# Altium integrated library CoLib.IntLib: 649 symbols (part 1 of 5) (continued)
## 精密电阻 1K
designator R?, comment 1K,0.1%,5ppm
精密电阻, 1K,  ± 0.1%, 1/8W, 5ppm, 0805; Manufacturer: PANASONIC; Ordering NO.: ERA6AEB102V; Name: 精密电阻
footprint R0805 (Chip Resistor; Body 2.0 x 1.3 mm (LxW typ))
pins: 1, 2

## 精密电阻 1K/0603
designator R?, comment 1K,0.1%,10ppm
精密电阻, 1K,  ± 0.1%, 1/10W, 10ppm, 0603; Manufacturer: VISHAY; Ordering NO.: TNPW06031K00BYEN; Name: 精密电阻
footprint R0603 (Chip Resistor, Body 60x30mil (1.6x0.8mm))
pins: 1, 2

## 精密电阻 2K
designator R?, comment 2K,0.1%,5ppm
精密电阻, 2K, ± 0.1%, 1/8W, 5ppm, 0805; Manufacturer: WELWYN; Ordering NO.: PCF0805-13-24K-B-T1; Name: 精密电阻
footprint R0805 (Chip Resistor; Body 2.0 x 1.3 mm (LxW typ))
pins: 1, 2

## 精密电阻 20K
designator R?, comment 20K,0.1%,25ppm
精密电阻, 20K,  ± 0.1%, 1/8W, 25ppm, 0805; Manufacturer: Panasonic; Ordering NO.: ERA6AEB203; Name: 精密电阻
footprint R0805 (Chip Resistor; Body 2.0 x 1.3 mm (LxW typ))
pins: 1, 2

## 精密电阻 24K
designator R?, comment 24K,0.05%,10ppm
精密电阻, 24K,  ± 0.05%, 1/8W, 10ppm, 0805; Manufacturer: Panasonic; Ordering NO.: ERA6ARW243V; Tips: 给AO212模块通道使用，RS库存编号662-1369; Name: 精密电阻
footprint R0805 (Chip Resistor; Body 2.0 x 1.3 mm (LxW typ))
pins: 1, 2

## 精密电阻 49.9R
designator R?, comment 49.9R,0.1%,15ppm
精密电阻, 49.9R,  ± 0.1%, 0.1W, 15ppm, 0805; Manufacturer: TE Connectivity; Ordering NO.: RP73D2A49R9BTG; Name: 精密电阻
footprint R0805 (Chip Resistor; Body 2.0 x 1.3 mm (LxW typ))
pins: 1, 2

## 精密电阻 100K
designator R?, comment 100K,0.1%,25ppm
精密电阻, 100K,  ± 0.1%, 1/8W, 25ppm, 0805; Manufacturer: Panasonic; Ordering NO.: ERA6AEB104; Name: 精密电阻
footprint R0805 (Chip Resistor; Body 2.0 x 1.3 mm (LxW typ))
pins: 1, 2

## 精密电阻 102R
designator R?, comment 102R,0.1%,10ppm
精密电阻, 102R,  ± 0.1%, 1/8W, 10ppm, 0805; Manufacturer: TE Connectivity; Ordering NO.: RN73C2A102RB; Name: 精密电阻
footprint R0805 (Chip Resistor; Body 80x50mil (2.0 x 1.3 mm))
pins: 1, 2

## 精密电阻 249R
designator R?, comment 249R,0.1%,5ppm
精密电阻, 249R,  ± 0.1%, 1/8W, 5ppm, 0805; Manufacturer: TE CONNECTIVITY; Ordering NO.: RN73C2A249RBTDF; Name: 精密电阻
footprint R0805 (Chip Resistor; Body 2.0 x 1.3 mm (LxW typ))
pins: 1, 2

## 精密电阻 499K
designator R?, comment 499K,0.1%,5ppm
精密电阻, 499K,  ± 0.1%, 1/8W, 25ppm, 0805; Manufacturer: SUSUMU; Ordering NO.: RR1220P-4993-B-M-T5; Name: 精密电阻
footprint R0805 (Chip Resistor; Body 2.0 x 1.3 mm (LxW typ))
pins: 1, 2


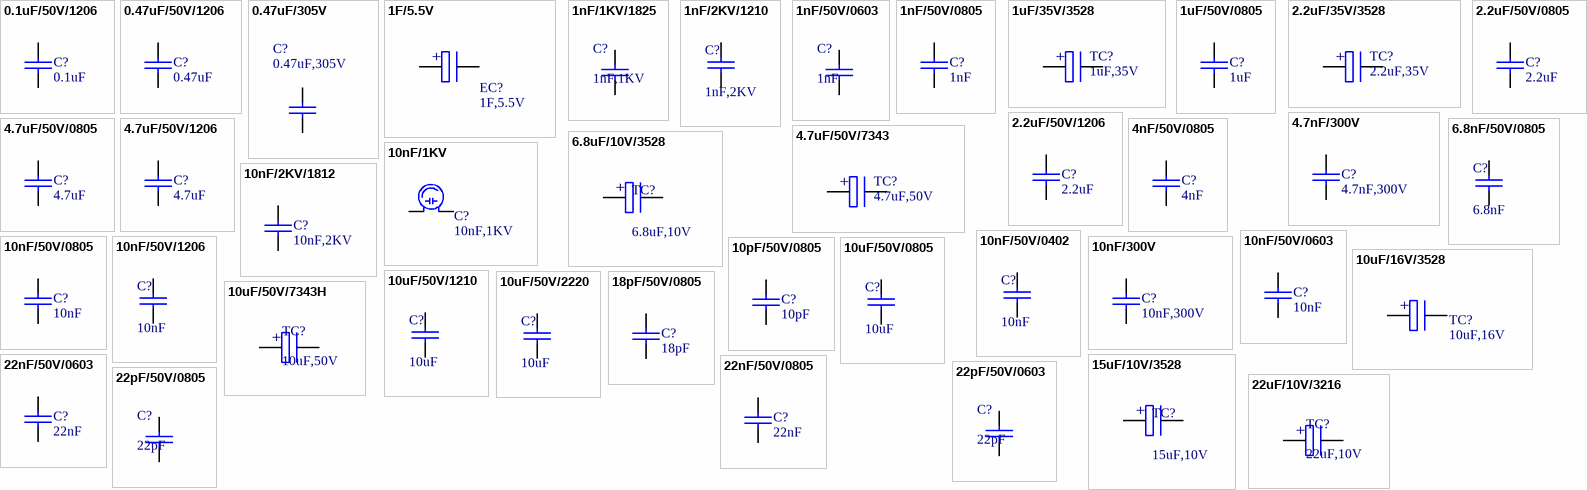
[diagram p4: symbols 0.1uF/50V/1206 to 22uF/10V/3216]

## 0.1uF/50V/1206
designator C?, comment 0.1uF
普通电容, 0.1uF, X7R, 50V, 10％, 1206; Manufacturer: TDK; Name: 普通电容; Ordering NO.: 0.1uF
footprint C1206 (Chip Capacitor, Body 3.2x1.6mm, IPC Medium Density)
pins: 1, 2

## 0.47uF/50V/1206
designator C?, comment 0.47uF
普通电容, 0.47uF, X7R, 50V, 10％, 1206; Manufacturer: TDK; Name: 普通电容; Ordering NO.: 0.47uF
footprint C1206 (Chip Capacitor, Body 3.2x1.6mm, IPC Medium Density)
pins: 1, 2

## 0.47uF/305V
designator C?, comment 0.47uF,305V
安规电容-X电容,0.47uF,305VAC,直插; Manufacturer: Epcos; Ordering NO.: B32933B3474K; Name: 安规电容- X电容
footprint CAP-22.5
pins: 1, 2

## 1F/5.5V
designator EC?, comment 1F,5.5V
铝电解电容,1F,20%,5.5V,直插; Manufacturer: KAMCAP; Ordering NO.: SCCB5R5105C; Name: 铝电解电容
footprint CAPC-5.08 (超级电容直插封装,直径800mil,pitch=200mil)
pins: 1 P, 2 P
text: +

## 1nF/1KV/1825
designator C?, comment 1nF,1KV
高压电容, 1nF, 10%, 1KV, 1825, C0G; Manufacturer: AVX; tips: 地线间EMC电容,体积大; 物料替代型号: 1825AC102JAT1A(5%); Ordering NO.: 1825AC102KAT1A; Tips: 1825,1000V,C0G,10%,有铅,; Name: 高压电容; Price: 0.51
footprint C1825 (贴片电容1825, 180 x 250 mil)
pins: 1, 2

## 1nF/2KV/1210
designator C?, comment 1nF,2KV
高压电容, 1nF, X7R, 2KV, 10％, 1210; Manufacturer: Syfer Technology; Ordering NO.: 1210Y2K00102KXT; Name: 高压电容
footprint C1210 (公制名称为3225)
pins: 1, 2

## 1nF/50V/0603
designator C?, comment 1nF
高频电容, 1nF, 5%, 50V, 0603, C0G; Manufacturer: AVX; Ordering NO.: 06035A102JAT2A; tips: 贴片0603,102%5/50V,C0G; 物料替代型号: 村田; Tips: 虽为高频电容,做EMC也是不错的; Name: 高频电容; Price: 0.02
footprint C0603 (Chip Capacitor, Body 1.6x0.8mm, IPC Medium Density)
pins: 1, 2

## 1nF/50V/0805
designator C?, comment 1nF
普通电容, 1nF, X7R, 50V, 10％, 0805; Manufacturer: TDK; Ordering NO.: 1nF; Name: 普通电容
footprint C0805 (Chip Capacitor, Body 2.0x1.3mm, IPC Medium Density)
pins: 1, 2

## 1uF/35V/3528
designator TC?, comment 1uF,35V
钽电容, 1uF, 35V, 10％, 3528; Manufacturer: AVX; Name: 钽电容; Ordering NO.: 1uF
footprint C3528 (B,Chip Capacitor, Body 3.5x2.8mm)
pins: 1 P, 2 P
text: +

## 1uF/50V/0805
designator C?, comment 1uF
普通电容, 1uF, X7R, 50V, 10％, 0805; Manufacturer: TDK; Ordering NO.: 1uF; Name: 普通电容
footprint C0805 (Chip Capacitor, Body 2.0x1.3mm, IPC Medium Density)
pins: 1, 2

## 2.2uF/35V/3528
designator TC?, comment 2.2uF,35V
钽电容, 2.2uF, 35V, 10％, 3528; Manufacturer: AVX; Name: 钽电容; Ordering NO.: 2.2uF
footprint C3528 (B,Chip Capacitor, Body 3.5x2.8mm)
pins: 1 P, 2 P
text: +

## 2.2uF/50V/0805
designator C?, comment 2.2uF
普通电容, 2.2uF, X7R, 50V, 10％, 0805; Manufacturer: TDK; Name: 普通电容; Ordering NO.: 2.2uF
footprint C0805 (Chip Capacitor, Body 2.0x1.3mm, IPC Medium Density)
pins: 1, 2

## 2.2uF/50V/1206
designator C?, comment 2.2uF
普通电容, 2.2uF, X7R, 50V, 10％, 1206; Manufacturer: TDK; Name: 普通电容; Ordering NO.: 2.2uF
footprint C1206 (Chip Capacitor, Body 3.2x1.6mm, IPC Medium Density)
pins: 1, 2

## 4.7nF/300V
designator C?, comment 4.7nF,300V
安规电容-Y电容,4.7nF,300V,10%,直插; Manufacturer: Epcos; Ordering NO.: B32021A3472K; Tips: 薄膜电容，用于EMI抑制; Name: 安规电容-Y电容
footprint CAP-10 (长*宽为13*5)
pins: 1, 2

## 4.7uF/50V/0805
designator C?, comment 4.7uF
普通电容, 4.7uF, X7R, 50V, 10％, 0805; Manufacturer: TDK; Name: 普通电容; Ordering NO.: 4.7uF
footprint C0805 (Chip Capacitor, Body 2.0x1.3mm, IPC Medium Density)
pins: 1, 2

## 4.7uF/50V/1206
designator C?, comment 4.7uF
普通电容, 4.7uF, X7R, 50V, 10％, 1206; Manufacturer: TDK; Name: 普通电容; Ordering NO.: 4.7uF
footprint C1206
pins: 1, 2

## 4.7uF/50V/7343
designator TC?, comment 4.7uF,50V
钽电容, 4.7uF, 50V, 10％, 7343; Manufacturer: AVX; Name: 钽电容; Ordering NO.: 4.7uF
footprint C7343 (D,Chip Capacitor, Body7.3x4.3mm)
pins: 1 P, 2 P
text: +

## 4nF/50V/0805
designator C?, comment 4nF
普通电容, 4nF, X7R, 50V, 10％, 0805; Manufacturer: TDK; Name: 普通电容; Ordering NO.: 4nF
footprint C0805 (Chip Capacitor, Body 2.0x1.3mm, IPC Medium Density)
pins: 1, 2

## 6.8nF/50V/0805
designator C?, comment 6.8nF
普通电容, 6.8nF, X7R, 50V, 10％, 0805; Manufacturer: TDK; Ordering NO.: 6.8nF; Name: 普通电容
footprint C0805
pins: 1, 2

## 6.8uF/10V/3528
designator TC?, comment 6.8uF,10V
钽电容, 6.8uF,10V, 10％, 3528; Manufacturer: AVX; Ordering NO.: TPSB685K010R1300; Name: 钽电容
footprint C3528 (B封装,极性电容, Body 3.5x2.8mm)
pins: 1 P, 2 P
text: +

## 10nF/1KV
designator C?, comment 10nF,1KV
高压瓷片电容, 10nF, 1000V,直插; Manufacturer: TDK; Tips: 高压瓷片电容10nF/1KV; Name: 高压瓷片电容; 物料替代型号: n/a; Ordering NO.: 10nF; Price: 0.8
footprint CAP-5 (Footprint not found)
pins: 1, 2

## 10nF/2KV/1812
designator C?, comment 10nF,2KV
高压电容, 10nF, 2KV, 1812; Manufacturer: AVX; Ordering NO.: 1812GC103KAT3A; Name: 高压电容
footprint C1812 (Chip Capacitor, 2-Leads, Body 4.5x3.2mm, IPC Medium Density)
pins: 1, 2

## 10nF/50V/0402
designator C?, comment 10nF
普通电容, 10nF, X7R, 50V, 10％, 0402; Manufacturer: TDK; Ordering NO.: 10nF; Name: 普通电容
footprint C0402-BGA
pins: 1, 2

## 10nF/50V/0603
designator C?, comment 10nF
普通电容, 10nF, X7R, 50V, 10％, 0603; Manufacturer: TDK; Ordering NO.: 10nF; Name: 普通电容
footprint C0603 (Chip Capacitor, Body 1.6x0.8mm, IPC Medium Density)
pins: 1, 2

## 10nF/50V/0805
designator C?, comment 10nF
普通电容, 10nF, X7R, 50V, 10％, 0805; Manufacturer: TDK; Ordering NO.: 10nF; Name: 普通电容
footprint C0805 (Chip Capacitor, Body 2.0x1.3mm, IPC Medium Density)
pins: 1, 2

## 10nF/50V/1206
designator C?, comment 10nF
普通电容, 10nF, X7R, 50V, 10％, 1206; Manufacturer: TDK; Name: 普通电容; Ordering NO.: 10nF
footprint C1206 (Chip Capacitor, Body 3.2x1.6mm, IPC Medium Density)
pins: 1, 2

## 10nF/300V
designator C?, comment 10nF,300V
安规电容-Y电容,10nF,300V,10%,直插; Manufacturer: Epcos; Ordering NO.: B32022A3103K; Tips: 薄膜电容，用于EMI抑制; Name: 安规电容-Y电容
footprint CAP-15 (长*宽*高为18*5*10.5)
pins: 1, 2

## 10pF/50V/0805
designator C?, comment 10pF
普通电容, 10pF, X7R, 50V, 10％, 0805; Manufacturer: TDK; Name: 普通电容; Ordering NO.: 10pF
footprint C0805 (Chip Capacitor, Body 2.0x1.3mm, IPC Medium Density)
pins: 1, 2

## 10uF/16V/3528
designator TC?, comment 10uF,16V
钽电容, 10uF, 16V, 10％, 3528; Manufacturer: AVX; Ordering NO.: TPSB106K016R0500; Name: 钽电容
footprint C3528 (B,Chip Capacitor, Body 3.5x2.8mm)
pins: 1 P, 2 P
text: +

## 10uF/50V/0805
designator C?, comment 10uF
普通电容, 10uF, X7R, 50V, 10％, 0805; Manufacturer: TDK; Name: 普通电容; Ordering NO.: 10uF
footprint C0805 (Chip Capacitor, Body 2.0x1.3mm, IPC Medium Density)
pins: 1, 2

## 10uF/50V/1210
designator C?, comment 10uF
普通电容, 10uF, X7S, 50V, 10％, 1210; Manufacturer: TDK; Ordering NO.: C3225X7S1H106KT000N; Name: 普通电容
footprint C1210 (贴片电容有极性1210,138x110mil)
pins: 1, 2

## 10uF/50V/2220
designator C?, comment 10uF
普通电容, 10uF, X7R, 50V, 10％, 2220; Manufacturer: TDK; Name: 普通电容; Ordering NO.: 10uF
footprint C2220
pins: 1, 2

## 10uF/50V/7343H
designator TC?, comment 10uF,50V
钽电容, 10uF, 50V, 7343H; Manufacturer: AVX; Ordering NO.: TPSE106M050R0500; Tips: 贴片极性去耦滤波电容,2917,E型,10uF%20/50V,500mR@100KHz,(钽/电解); 物料替代型号: TPSE106M050R0400,村田; Name: 钽电容; Price: 2.01
footprint C7343H (E封装,极性电容, Body7.3x4.3mm)
pins: 1 P, 2 P
text: +

## 15uF/10V/3528
designator TC?, comment 15uF,10V
钽电容, 15uF,10V, 10％, 3528; Manufacturer: AVX; Ordering NO.: TPSB156K010R0450; Name: 钽电容
footprint C3528 (B封装,极性电容, Body 3.5x2.8mm)
pins: 1 P, 2 P
text: +

## 18pF/50V/0805
designator C?, comment 18pF
普通电容, 18pF, X7R, 50V, 10％, 0805; Manufacturer: TDK; Name: 普通电容; Ordering NO.: 18pF
footprint C0805 (Chip Capacitor, Body 2.0x1.3mm, IPC Medium Density)
pins: 1, 2

## 22nF/50V/0603
designator C?, comment 22nF
普通电容, 22nF, X7R, 50V, 10％, 0603; Manufacturer: TDK; Name: 普通电容; Ordering NO.: 22nF
footprint C0603 (Chip Capacitor, Body 1.6x0.8mm, IPC Medium Density)
pins: 1, 2

## 22nF/50V/0805
designator C?, comment 22nF
普通电容, 22nF, X7R, 50V, 10％, 0805; Manufacturer: TDK; Name: 普通电容; Ordering NO.: 22nF
footprint C0805 (Chip Capacitor, Body 2.0x1.3mm, IPC Medium Density)
pins: 1, 2

## 22pF/50V/0603
designator C?, comment 22pF
高频电容, 22pF, 50V, 0603, C0G; Manufacturer: AVX; Ordering NO.: 06035A220JAT2A; tips: 贴片0603,22pF%5/50V,C0G; 物料替代型号: 村田; Tips: 虽为高频电容,做EMC也是不错的; Name: 高频电容; Price: 0.02
footprint C0603 (Chip Capacitor, Body 1.6x0.8mm, IPC Medium Density)
pins: 1, 2

## 22pF/50V/0805
designator C?, comment 22pF
高频电容, 22pF, 50V, 0805, C0G; Manufacturer: AVX; Ordering NO.: 08055A220JAT2A; 物料替代型号: 村田; tips: 虽为高频电容,做EMC也是不错的; Tips: 贴片0805,22pF%5/50V,C0G; Name: 高频电容; Price: 0.02
footprint C0805 (Chip Capacitor, Body 2.0x1.3mm, IPC Medium Density)
pins: 1, 2

## 22uF/10V/3216
designator TC?, comment 22uF,10V
钽电容, 22uF, 10V, 3216, 900mR@100KH; Manufacturer: AVX; Ordering NO.: TPSA226K010R0900; Tips: 贴片极性去耦滤波电容1206,22uF%10/10V,900mR@100KHz,(钽/电解); 物料替代型号: TPSA336K010R0700,村田; Name: 钽电容; Price: 0.20
footprint C3216 (A封装,极性电容, Body 3.2x1.6mm)
pins: 1 P, 2 P
text: +

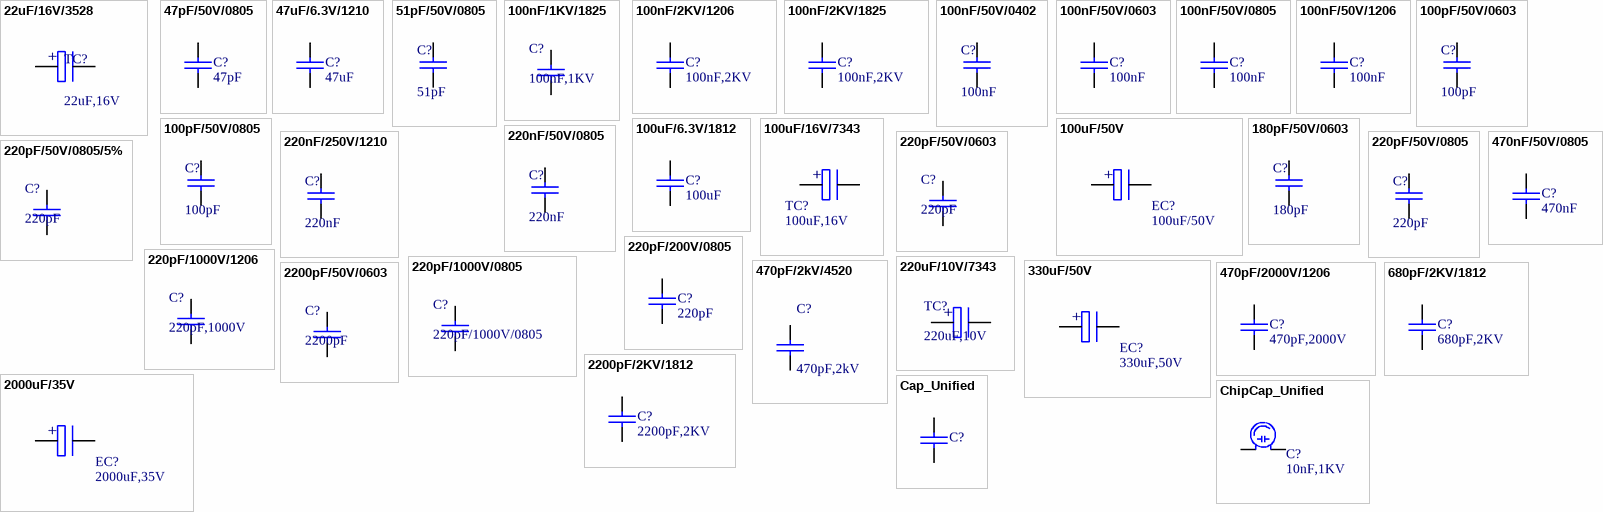
[diagram p5: symbols 22uF/16V/3528 to ChipCap_Unified]

## 22uF/16V/3528
designator TC?, comment 22uF,16V
钽电容,22uF,16V, 10％, 3528; Manufacturer: AVX; Ordering NO.: TPSB226K016R0400; Name: 钽电容
footprint C3528 (B封装,极性电容, Body 3.5x2.8mm)
pins: 1 P, 2 P
text: +

## 47pF/50V/0805
designator C?, comment 47pF
普通电容, 47pF, X7R, 50V, 10％, 0805; Manufacturer: TDK; Name: 普通电容; Ordering NO.: 47pF
footprint C0805 (Chip Capacitor, Body 2.0x1.3mm, IPC Medium Density)
pins: 1, 2

## 47uF/6.3V/1210
designator C?, comment 47uF
普通电容, 47uF, X5R, 6.3V, 1210; Manufacturer: TDK; Name: 普通电容; Ordering NO.: 47uF
footprint C1210 (公制名称为3225)
pins: 1, 2

## 51pF/50V/0805
designator C?, comment 51pF
普通电容, 51pF, X7R, 50V, 10％, 0805; Manufacturer: TDK; Name: 普通电容; Ordering NO.: 51pF
footprint C0805 (Chip Capacitor, Body 2.0x1.3mm, IPC Medium Density)
pins: 1, 2

## 100nF/1KV/1825
designator C?, comment 100nF,1KV
高压电容, 100nF, 10%, 1000V, 1825, C0G, 有铅; Manufacturer: AVX; tips: 地线间EMC电容,体积大; 物料替代型号: 1825AC104JAT1A(5%); Ordering NO.: 1825AC104KAT1A; Tips: 1825,1000V,C0G,10%,有铅,; Name: 高压电容; Price: 0.51
footprint C1825 (贴片电容1825, 180 x 250 mil)
pins: 1, 2

## 100nF/2KV/1206
designator C?, comment 100nF,2KV
高压电容, 100nF, 2KV, 10％, 1206; Manufacturer: TDK; Ordering NO.: CGA5L4X7T2W104K160AA; Name: 高压电容
footprint C1206 (Chip Capacitor, Body 3.2x1.6mm, IPC Medium Density)
pins: 1, 2

## 100nF/2KV/1825
designator C?, comment 100nF,2KV
高压电容, 100nF, 2KV, 10％, 1825; Manufacturer: TDK; Name: 高压电容; Ordering NO.: 100nF
footprint C1825 (贴片电容1825, 180 x 250 mil)
pins: 1, 2

## 100nF/50V/0402
designator C?, comment 100nF
普通电容, 100nF, X7R, 50V, 10％, 0402; Manufacturer: TDK; Ordering NO.: 100nF; Name: 普通电容
footprint C0402-BGA
pins: 1, 2

## 100nF/50V/0603
designator C?, comment 100nF
普通电容, 100nF, X7R, 50V, 10％, 0603; Manufacturer: TDK; Ordering NO.: 100nF; Name: 普通电容
footprint C0603
pins: 1, 2

## 100nF/50V/0805
designator C?, comment 100nF
普通电容, 100nF, X7R, 50V, 10％, 0805; Manufacturer: TDK; Ordering NO.: 100nF; Name: 普通电容
footprint C0805 (Chip Capacitor, Body 2.0x1.3mm, IPC Medium Density)
pins: 1, 2

## 100nF/50V/1206
designator C?, comment 100nF
普通电容, 100nF, X7R, 50V, 10％, 1206; Manufacturer: TDK; Name: 普通电容; Ordering NO.: 100nF
footprint C1206 (Chip Capacitor, Body 3.2x1.6mm, IPC Medium Density)
pins: 1, 2

## 100pF/50V/0603
designator C?, comment 100pF
普通电容, 100pF, X7R, 50V, 10％, 0603; Manufacturer: TDK; Ordering NO.: 100pF; Name: 普通电容
footprint C0603
pins: 1, 2

## 100pF/50V/0805
designator C?, comment 100pF
普通电容, 100pF, X7R, 50V, 10％, 0805; Manufacturer: TDK; Ordering NO.: 100pF; Name: 普通电容
footprint C0805 (Chip Capacitor, Body 2.0x1.3mm, IPC Medium Density)
pins: 1, 2

## 100uF/6.3V/1812
designator C?, comment 100uF
普通电容, 100uF, X5R, 6.3V, 1812; Manufacturer: TDK; Name: 普通电容; Ordering NO.: 100uF
footprint C1812
pins: 1, 2

## 100uF/16V/7343
designator TC?, comment 100uF,16V
钽电容, 100uF, 16V, 10%,7343; Manufacturer: AVX; Ordering NO.: TPSD107K016R0060; Name: 钽电容
footprint C7343 (D,Chip Capacitor, Body7.3x4.3mm)
pins: 1 P, 2 P
text: +

## 100uF/50V
designator EC?
铝电解电容,100uF,20%,50V,表贴; Manufacturer: Panasonic; Ordering NO.: EEHZA1H101P; Name: 铝电解电容
footprint CP1210 (G,Conductive Polymer Hybrid Aluminum Electrolytic Capacitors,12X10.3X10.5mm)
pins: 1 P, 2 P
text: +

## 180pF/50V/0603
designator C?, comment 180pF
普通电容,180pF, 5％,50V, 0603,C0G; Manufacturer: TDK; Name: 普通电容; Ordering NO.: 180pF
footprint C0603 (Chip Capacitor, Body 1.6x0.8mm, IPC Medium Density)
pins: 1, 2

## 220nF/50V/0805
designator C?, comment 220nF
普通电容, 220nF, X7R, 50V, 10％, 0805; Manufacturer: TDK; Name: 普通电容; Ordering NO.: 220nF
footprint C0805 (Chip Capacitor, Body 2.0x1.3mm, IPC Medium Density)
pins: 1, 2

## 220nF/250V/1210
designator C?, comment 220nF
普通电容, 220nF, X5R, 250V, 10％, 1210; Manufacturer: TDK; Name: 普通电容; Ordering NO.: 220nF
footprint C1210 (公制名称为3225)
pins: 1, 2

## 220pF/50V/0603
designator C?, comment 220pF
高频电容, 220pF, 5%, 50V, 0603, C0G; Manufacturer: AVX; Ordering NO.: 06035A221JAT2A; tips: 贴片0603,220pF%5/50V,C0G; 物料替代型号: 村田; Tips: 虽为高频电容,做EMC也是不错的; Name: 高频电容; Price: 0.02
footprint C0603 (Chip Capacitor, Body 1.6x0.8mm, IPC Medium Density)
pins: 1, 2

## 220pF/50V/0805
designator C?, comment 220pF
普通电容, 220pF, X7R, 50V, 10％, 0805; Manufacturer: TDK; Name: 普通电容; Ordering NO.: 220pF
footprint C0805 (Footprint not found)
pins: 1, 2

## 220pF/50V/0805/5%
designator C?, comment 220pF
高频电容, 220pF, 5%, 50V, 0805, C0G; Manufacturer: AVX; Ordering NO.: 08055A221JAT2A; tips: 贴片0805,220pF%5/50V,C0G; 物料替代型号: 村田; Tips: 虽为高频电容,做EMC也是不错的; Name: 高频电容; Price: 0.02
footprint C0805 (Chip Capacitor, Body 2.0x1.3mm, IPC Medium Density)
pins: 1, 2

## 220pF/200V/0805
designator C?, comment 220pF
高频电容, 220pF, 5%, 200V, 0805, C0G; Manufacturer: AVX; Ordering NO.: 08052A221JAT2A; tips: 贴片0805,220pF%5/200V,C0G; 物料替代型号: 村田; Tips: 虽为高频电容,做EMC也是不错的; Name: 高频电容; Price: 0.02
footprint C0805 (Chip Capacitor, Body 2.0x1.3mm, IPC Medium Density)
pins: 1, 2

## 220pF/1000V/0805
designator C?
高压电容, 220pF, X7R, 5%, 1000V, 0805; Manufacturer: AVX; Ordering NO.: 0805AA221JAT1A; Tips: 小型220pF EMC电容; Price: 0.50; Name: 高压电容
footprint C0805 (Chip Capacitor, Body 2.0x1.3mm, IPC Medium Density)
pins: 1, 2

## 220pF/1000V/1206
designator C?, comment 220pF,1000V
高压电容, 220pF, X7R, 5%, 1000V, 1206; Manufacturer: AVX; 物料替代型号: 1206AA221JAT1A; Tips: EMC电容,体积大; Price: 0.50; Name: 高压电容; Ordering NO.: 220pF
footprint C1206 (Chip Capacitor, Body 3.2x1.6mm, IPC Medium Density)
pins: 1, 2

## 220uF/10V/7343
designator TC?, comment 220uF,10V
钽电容, 220uF, 20％, 10V, 7343; Manufacturer: SANYO/Panasonic; Ordering NO.: 10TPB220M; Tips: 电源用极性电容; Name: 钽电容
footprint C7343 (D封装,极性电容, Body7.3x4.3mm)
pins: 1 P, 2 N
text: +

## 330uF/50V
designator EC?, comment 330uF,50V
铝电解电容,330uF,20%,50V,直插; Manufacturer: Panasonic; Ordering NO.: EEUTA1H331S; Name: 铝电解电容
footprint CAPC-7.5-D16 (Body Dia. 16mm,Lead space 7.5mm)
pins: 1 P, 2 P
text: +

## 470nF/50V/0805
designator C?, comment 470nF
普通电容, 470nF, X7R, 50V, 10％, 0805; Manufacturer: TDK; Name: 普通电容; Ordering NO.: 470nF
footprint C0805
pins: 1, 2

## 470pF/2kV/4520
designator C?, comment 470pF,2kV
高压电容,470pF,2kV,4520; Ordering NO.: GR442QR73D471KW01L; Name: 高压电容
footprint C4520 (Chip Capacitor, Body 4.5x2.0mm)
pins: 1, 2

## 470pF/2000V/1206
designator C?, comment 470pF,2000V
高压电容, 470pF, 2000V, 1206; Manufacturer: Muiticomp; Ordering NO.: MCA000784; Name: 高压电容
footprint C1206 (Chip Capacitor, Body 3.2x1.6mm, IPC Medium Density)
pins: 1, 2

## 680pF/2KV/1812
designator C?, comment 680pF,2KV
高压电容, 680pF,2KV, 1812; Manufacturer: AVX; Ordering NO.: 1812GC681KAT1A; Name: 高压电容
footprint C1812
pins: 1, 2

## 2000uF/35V
designator EC?, comment 2000uF,35V
铝电解电容,2000uF,20%,35V,直插; Manufacturer: Panasonic; Ordering NO.: EEUTP1V202S; Name: 铝电解电容
footprint CAPC-7.5-D18 (Body Dia. 18mm,Lead space 7.5mm)
pins: 1 P, 2 P
text: +

## 2200pF/2KV/1812
designator C?, comment 2200pF,2KV
高压电容, 2200pF, 2KV, 1812; Manufacturer: AVX; Ordering NO.: 1812GC222KAT1A; Name: 高压电容
footprint C1812
pins: 1, 2

## 2200pF/50V/0603
designator C?, comment 2200pF
高频电容, 2200pF, 5%, 50V, 0603, C0G; Manufacturer: AVX; Ordering NO.: 06035A221JAT2A; tips: 贴片0603,221%5/50V,C0G; 物料替代型号: 村田; Tips: 虽为高频电容,做EMC也是不错的; Name: 高频电容; Price: 0.02
footprint C0603 (Chip Capacitor, Body 1.6x0.8mm, IPC Medium Density)
pins: 1, 2

## Cap_Unified
designator C?
普通电容,通用; Price: 0.02; Name: 普通电容
footprint C0805 (Chip Capacitor, Body 2.0x1.3mm, IPC Medium Density)
footprint C0603 (Chip Capacitor, Body 1.6x0.8mm, IPC Medium Density)
footprint C0402 (Footprint not found)
footprint C1206 (Chip Capacitor, Body 3.2x1.6mm, IPC Medium Density)
pins: 1, 2

## ChipCap_Unified
designator C?, comment 10nF,1KV
瓷片电容; Price: 0.8
footprint CAP-7.62 (Footprint not found)
pins: 1, 2


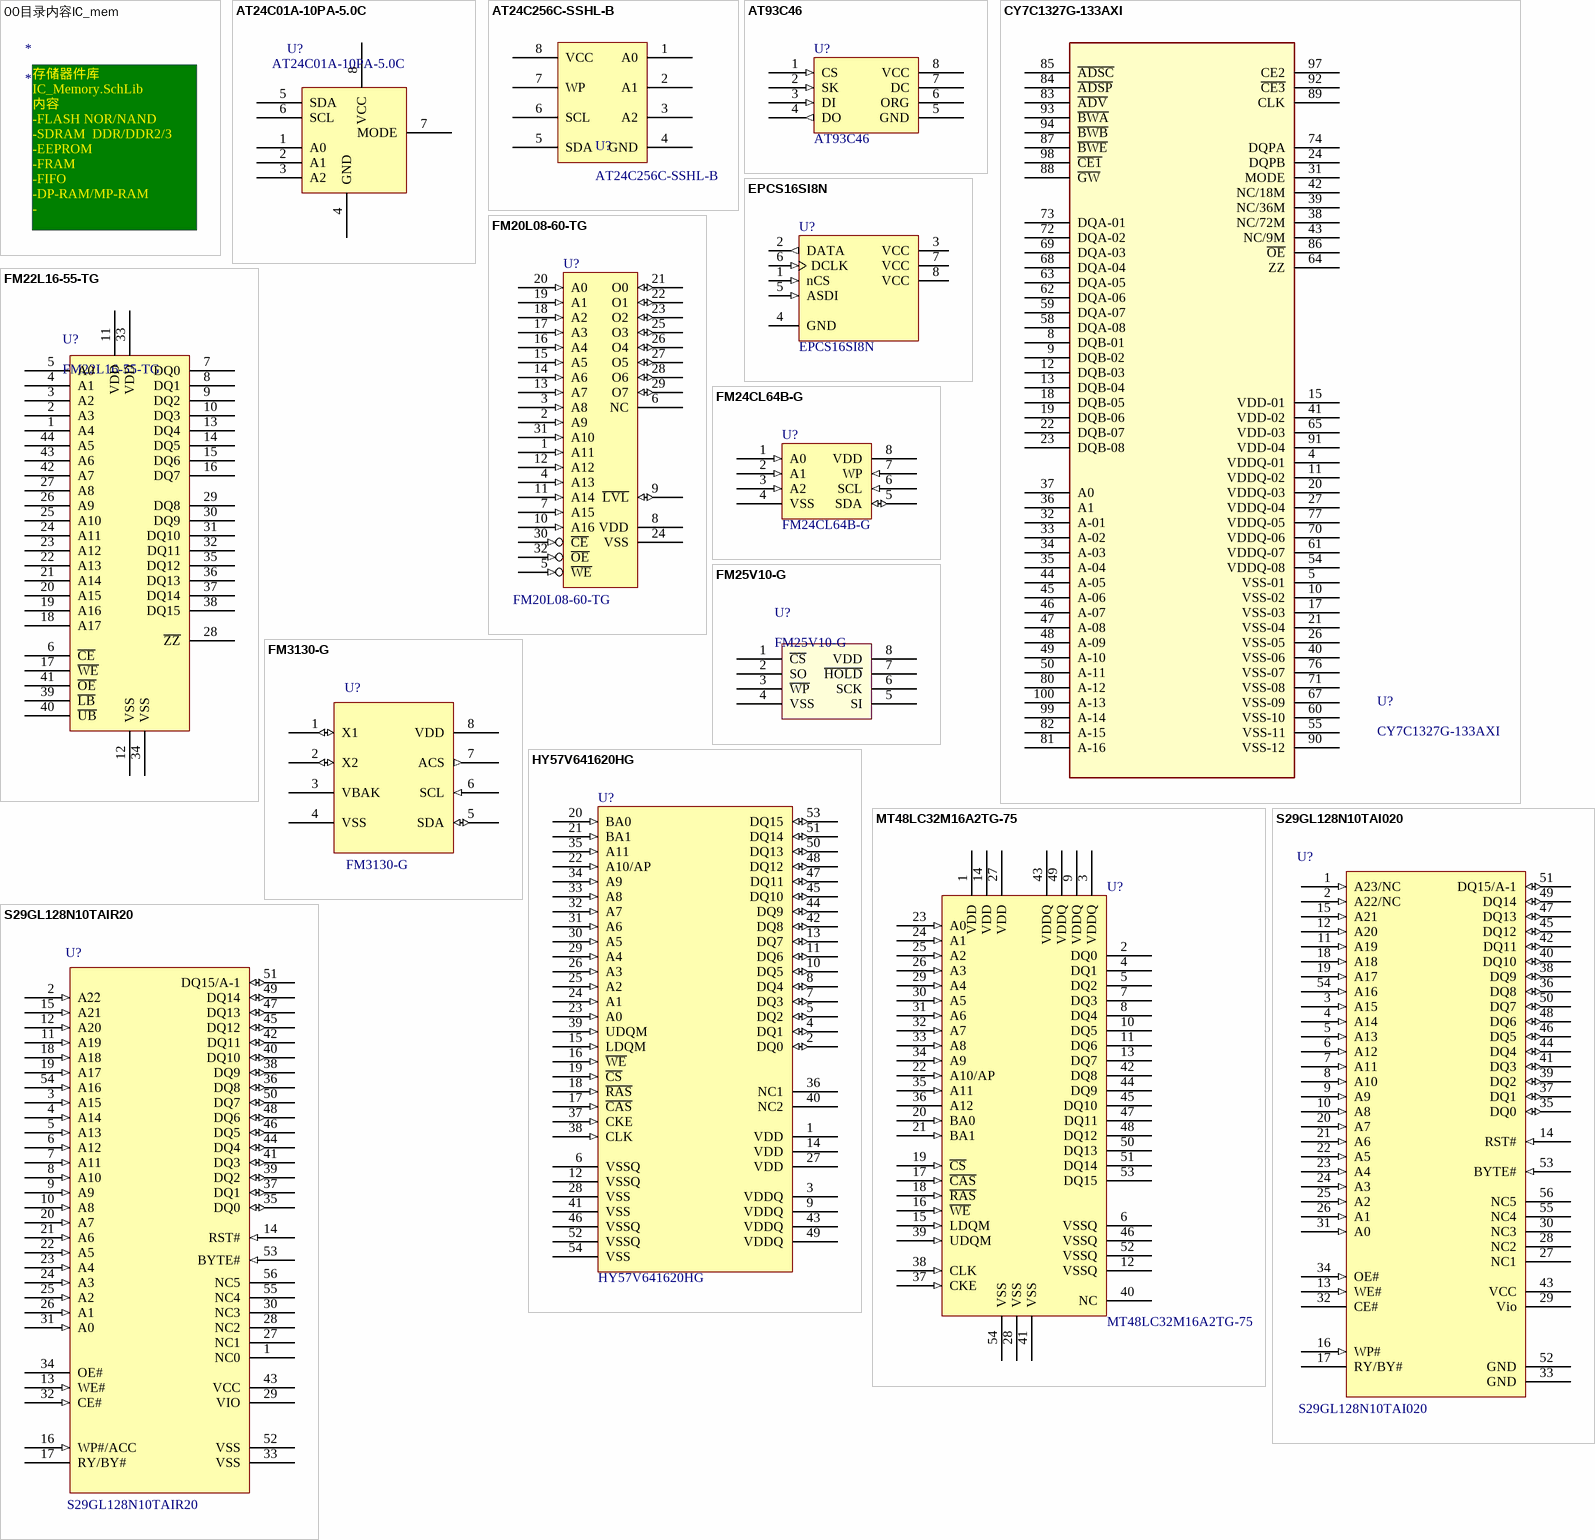
[diagram p6: symbols 00目录内容IC_mem to S29GL128N10TAIR20]

## 00目录内容IC_mem
designator *
text: 存储器件库 IC_Memory.SchLib / 内容 / -FLASH NOR/NAND / -SDRAM  DDR/DDR2/3 / -EEPROM / -FRAM / -FIFO / -DP-RAM/MP-RAM / - /

## AT24C01A-10PA-5.0C
designator U?
2K,256x8 EEPROM; Manufacturer: ATMEL; Price: 3.5; Ordering NO.: AT24C01A-10PA-5.0C; Name: EEPROM
footprint SO8/1.27_4.9*3.9 (SOIC, 8-Leads, Body 4.9x3.9mm, Pitch 1.27mm,)
pins: 1 A0, 2 A1, 3 A2, 4 GND, 5 SDA, 6 SCL, 7 MODE, 8 VCC

## AT24C256C-SSHL-B
designator U?
I2C-Compatible (2-Wire) Serial EEPROM  256-Kbit (32,768 x 8); Manufacturer: ATMEL; Name: EEPROM; Ordering NO.: AT24C256C-SSHL-B
footprint SO8/1.27_4.9*3.9 (SOIC, 8-Leads, Body 4.9x3.9mm, Pitch 1.27mm,)
pins: 1 A0, 2 A1, 3 A2, 4 GND, 5 SDA, 6 SCL, 7 WP, 8 VCC

## AT93C46
designator U?
3-Wire EEPROM; Manufacturer: ATMEL; Ordering NO.: AT93C46-10SI; Name: EEPROM
footprint SO8/1.27_4.9*3.9 (SOIC, 8-Leads, Body 4.9x3.9mm, Pitch 1.27mm,)
pins: 1 CS (in), 2 SK (in), 3 DI (in), 4 DO (out), 5 GND (power), 6 ORG (hiz), 7 DC (hiz), 8 VCC (power)

## CY7C1327G-133AXI
designator U?
4-Mbit (256K x 18) Pipelined Sync SRAM; Manufacturer: CYPRESS; Name: SRAM; Ordering NO.: CY7C1327G-133AXI
footprint TQFP100/0.65_14*20 (TQFP, 100-Leads, Body 22.2x16.2mm (max), Pitch 0.65mm, IPC Medium Density)
pins: 4 VDDQ-01, 5 VSS-01, 8 DQB-01, 9 DQB-02, 10 VSS-02, 11 VDDQ-02, 12 DQB-03, 13 DQB-04, 15 VDD-01, 17 VSS-03, 18 DQB-05, 19 DQB-06, 20 VDDQ-03, 21 VSS-04, 22 DQB-07, 23 DQB-08, 24 DQPB, 26 VSS-05, 27 VDDQ-04, 31 MODE, 32 A-01, 33 A-02, 34 A-03, 35 A-04, 36 A1, 37 A0, 38 NC/72M, 39 NC/36M, 40 VSS-06, 41 VDD-02, 42 NC/18M, 43 NC/9M, 44 A-05, 45 A-06, 46 A-07, 47 A-08, 48 A-09, 49 A-10, 50 A-11, 54 VDDQ-08, 55 VSS-11, 58 DQA-08, 59 DQA-07, 60 VSS-10, 61 VDDQ-07, 62 DQA-06, 63 DQA-05, 64 ZZ, 65 VDD-03, 67 VSS-09, 68 DQA-04, 69 DQA-03, 70 VDDQ-06, 71 VSS-08, 72 DQA-02, 73 DQA-01, 74 DQPA, 76 VSS-07, 77 VDDQ-05, 80 A-12, 81 A-16, 82 A-15, 83 ~{ADV}, 84 ~{ADSP}, 85 ~{ADSC}, 86 ~{OE}, 87 ~{BWE}, 88 ~{GW}, 89 CLK, 90 VSS-12, 91 VDD-04, 92 ~{CE3}, 93 ~{BWA}, 94 ~{BWB}, 97 CE2, 98 ~{CE1}, 99 A-14, 100 A-13

## EPCS16SI8N
designator U?
EPCS16 Series, In-system programmable 3.3V serial configuration device, 8-Pin SOIC, 16-Megabit, Industrial Grade, Pb-Free; Manufacturer: Altera; Name: FLASH; Ordering NO.: EPCS16SI8N
footprint SO8/1.27_4.9*3.9 (SOIC, 8-Leads, Body 4.9x3.9mm, Pitch 1.27mm,)
pins: 1 nCS (in) "Active low, chip select input", 2 DATA (out) "Serial data out", 3 VCC (power) "3.3V supply", 4 GND (power) "Ground", 5 ASDI (in) "AS data in", 6 DCLK (in) "Provides timing of the serial interface", 7 VCC (power) "3.3V supply", 8 VCC (power) "3.3V supply"

## FM20L08-60-TG
designator U?
1Mbit Bytewide F-RAM Memory; Manufacturer: Cypress Semiconductor Corporation; Name: 铁电存储器; Ordering NO.: FM20L08-60-TG
footprint TSOP32/0.5_11.8*8 (TSOP,32 Leads,Pitch=0.5mm,Body 11.8X8mm)
pins: 1 A11 (in), 2 A9 (in), 3 A8 (in), 4 A13 (in), 5 ~{WE} (in), 6 NC, 7 A15 (in), 8 VDD (power), 9 ~{LVL} (io), 10 A16 (in), 11 A14 (in), 12 A12 (in), 13 A7 (in), 14 A6 (in), 15 A5 (in), 16 A4 (in), 17 A3 (in), 18 A2 (in), 19 A1 (in), 20 A0 (in), 21 O0 (io), 22 O1 (io), 23 O2 (io), 24 VSS, 25 O3 (io), 26 O4 (io), 27 O5 (io), 28 O6 (io), 29 O7 (io), 30 ~{CE} (in), 31 A10 (in), 32 ~{OE} (in)

## FM22L16-55-TG
designator U?
512KB@16bits, 4Mbit Asynchronous F-RAM Memory; Manufacturer: Cypress Semiconductor Corporation; 物料说明: 512KB NV-SRAM 16bits; 物料型号说明: 55ns TSOP44; Name: 铁电存储器; Price: 120; Ordering NO.: FM22L16-55-TG
footprint TSOP44/0.8_18.41*10.16 (TSOP-II,44 Leads,Pitch=0.8mm,Body 18.4X10.16mm)
pins: 1 A4, 2 A3, 3 A2, 4 A1, 5 A0, 6 ~{CE}, 7 DQ0, 8 DQ1, 9 DQ2, 10 DQ3, 11 VDD, 12 VSS, 13 DQ4, 14 DQ5, 15 DQ6, 16 DQ7, 17 ~{WE}, 18 A17, 19 A16, 20 A15, 21 A14, 22 A13, 23 A12, 24 A11, 25 A10, 26 A9, 27 A8, 28 ~{ZZ}, 29 DQ8, 30 DQ9, 31 DQ10, 32 DQ11, 33 VDD, 34 VSS, 35 DQ12, 36 DQ13, 37 DQ14, 38 DQ15, 39 ~{LB}, 40 ~{UB}, 41 ~{OE}, 42 A7, 43 A6, 44 A5

## FM24CL64B-G
designator U?
64K bit Ferroelectric Nonvolatile RAM; Manufacturer: Cypress Semiconductor Corporation; Name: 铁电存储器; Ordering NO.: FM24CL64B-G
footprint SO8/1.27_4.9*3.9 (SOIC, 8-Leads, Body 4.9x3.9mm, Pitch 1.27mm,)
pins: 1 A0 (in), 2 A1 (in), 3 A2 (in), 4 VSS (power), 5 SDA (io), 6 SCL (in), 7 WP (in), 8 VDD (power)

## FM25V10-G
designator U?
1-Mbit(128Kx8) Serial (SPI) F-RAM; Manufacturer: Cypress Semiconductor Corporation; Name: 铁电存储器; Ordering NO.: FM25V10-G
footprint SO8/1.27_4.9*3.9 (SOIC, 8-Leads, Body 4.9x3.9mm, Pitch 1.27mm,)
pins: 1 ~{CS}, 2 SO, 3 ~{WP}, 4 VSS (power), 5 SI, 6 SCK, 7 ~{HOLD}, 8 VDD (power)

## FM3130-G
designator U?
Integrated RTC/Alarm and 64Kb FRAM; Manufacturer: Cypress Semiconductor Corporation; Name: 铁电存储器; Ordering NO.: FM3130-G
footprint SO8/1.27_4.9*3.9 (SOIC, 8-Leads, Body 4.9x3.9mm, Pitch 1.27mm,)
pins: 1 X1 (io), 2 X2 (io), 3 VBAK (power), 4 VSS (power), 5 SDA (io), 6 SCL (in), 7 ACS (out), 8 VDD (power)

## HY57V641620HG
designator U?
4 Banks x 1M x 16Bit Synchronous DRAM; Manufacturer: HYNIX; tips: 时钟频率和供电可选，采购号后缀决定; Ordering NO.: HY57V641620HG; Name: DRAM
footprint TSOP54/0.8_22.22*10.16 (TSOP-II,54 Leads,Pitch=0.8mm,Body 22.22X10.16mm)
pins: 1 VDD (power), 2 DQ0 (io), 3 VDDQ (power), 4 DQ1 (io), 5 DQ2 (io), 6 VSSQ (power), 7 DQ3 (io), 8 DQ4 (io), 9 VDDQ (power), 10 DQ5 (io), 11 DQ6 (io), 12 VSSQ (power), 13 DQ7 (io), 14 VDD (power), 15 LDQM (in), 16 ~{WE} (in), 17 ~{CAS} (in), 18 ~{RAS} (in), 19 ~{CS} (in), 20 BA0 (in), 21 BA1 (in), 22 A10/AP (in), 23 A0 (in), 24 A1 (in), 25 A2 (in), 26 A3 (in), 27 VDD (power), 28 VSS (power), 29 A4 (in), 30 A5 (in), 31 A6 (in), 32 A7 (in), 33 A8 (in), 34 A9 (in), 35 A11 (in), 36 NC1, 37 CKE (in), 38 CLK (in), 39 UDQM (in), 40 NC2, 41 VSS (power), 42 DQ8 (io), 43 VDDQ (power), 44 DQ9 (io), 45 DQ10 (io), 46 VSSQ (power), 47 DQ11 (io), 48 DQ12 (io), 49 VDDQ (power), 50 DQ13 (io), 51 DQ14 (io), 52 VSSQ (power), 53 DQ15 (io), 54 VSS (power)

## MT48LC32M16A2TG-75
designator U?
512Mb Synchronous High-Speed CMOS DRAM:8MBx16x4bank; Manufacturer: Micron; Name: SDRAM; Price: 12; 物料说明: SDRAM:8MBx16x4bank; Ordering NO.: MT48LC32M16A2TG-75; 物料型号说明: 8MBx16x4bank
footprint TSOP54/0.8_22.22*10.16 (TSOP-II,54 Leads,Pitch=0.8mm,Body 22.22X10.16mm)
pins: 1 VDD, 2 DQ0 (hiz), 3 VDDQ, 4 DQ1 (hiz), 5 DQ2 (hiz), 6 VSSQ, 7 DQ3 (hiz), 8 DQ4 (hiz), 9 VDDQ, 10 DQ5 (hiz), 11 DQ6 (hiz), 12 VSSQ, 13 DQ7 (hiz), 14 VDD, 15 LDQM (in), 16 ~{WE} (in), 17 ~{CAS} (in), 18 ~{RAS} (in), 19 ~{CS} (in), 20 BA0 (in), 21 BA1 (in), 22 A10/AP (in), 23 A0 (in), 24 A1 (in), 25 A2 (in), 26 A3 (in), 27 VDD, 28 VSS, 29 A4 (in), 30 A5 (in), 31 A6 (in), 32 A7 (in), 33 A8 (in), 34 A9 (in), 35 A11 (in), 36 A12, 37 CKE (in), 38 CLK (in), 39 UDQM (in), 40 NC, 41 VSS, 42 DQ8 (hiz), 43 VDDQ, 44 DQ9 (hiz), 45 DQ10 (hiz), 46 VSSQ, 47 DQ11 (hiz), 48 DQ12 (hiz), 49 VDDQ, 50 DQ13 (hiz), 51 DQ14 (hiz), 52 VSSQ, 53 DQ15 (hiz), 54 VSS

## S29GL128N10TAI020
designator U?
FLASH NOR 16MB; Manufacturer: SPANSION; 物料型号说明: 商业温度; Ordering NO.: S29GL128N10TAI020; Name: FLASH; Price: 30
footprint TSOP56/0.5_14*18.4
pins: 1 A23/NC (in), 2 A22/NC (in), 3 A15 (in), 4 A14 (in), 5 A13 (in), 6 A12 (in), 7 A11 (in), 8 A10 (in), 9 A9 (in), 10 A8 (in), 11 A19 (in), 12 A20 (in), 13 WE# (in), 14 RST# (in), 15 A21 (in), 16 WP# (in), 17 RY/BY# (oc), 18 A18 (in), 19 A17 (in), 20 A7 (in), 21 A6 (in), 22 A5 (in), 23 A4 (in), 24 A3 (in), 25 A2 (in), 26 A1 (in), 27 NC1, 28 NC2, 29 Vio (power), 30 NC3, 31 A0 (in), 32 CE#, 33 GND (power), 34 OE# (in), 35 DQ0 (io), 36 DQ8 (io), 37 DQ1 (io), 38 DQ9 (io), 39 DQ2 (io), 40 DQ10 (io), 41 DQ3 (io), 42 DQ11 (io), 43 VCC (power), 44 DQ4 (io), 45 DQ12 (io), 46 DQ5 (io), 47 DQ13 (io), 48 DQ6 (io), 49 DQ14 (io), 50 DQ7 (io), 51 DQ15/A-1 (io), 52 GND (power), 53 BYTE# (in), 54 A16 (in), 55 NC4, 56 NC5